# Altium footprint library Stepper_Board.PcbLib: 49 footprints (part 4 of 4)
Each footprint in its own frame and in the unit in brackets; x right, y up, seen from the top. Pads: shape width x height; smd on the part's side, far side on the other; paste and mask are expansions set on the pad; w line width, h text height; cw(c..) or ccw(c..) is an arc to the next point about the centre after c.
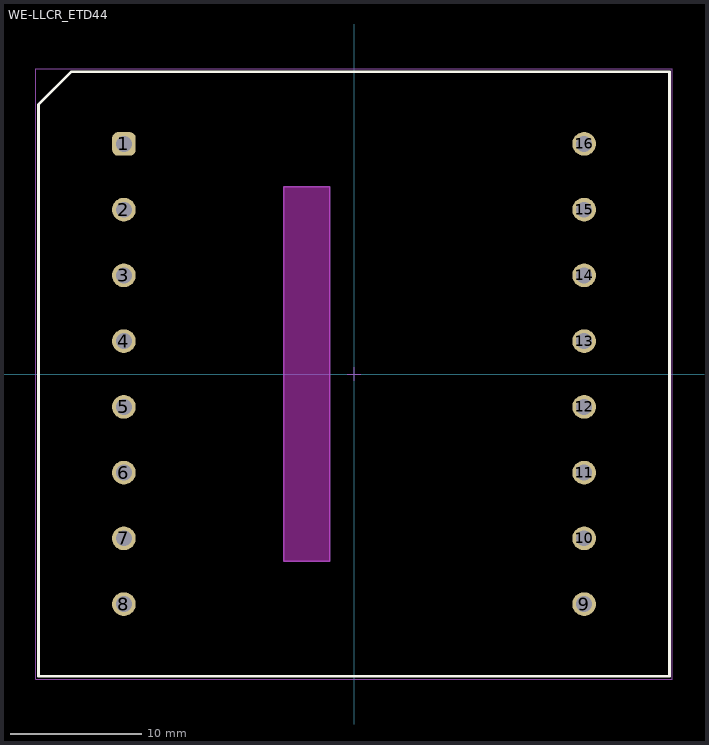
[diagram p3: the footprint, top view; thin cyan lines are the x and y axes]

## WE-LLCR_ETD44 [mm] "Resonant Converter, body 48x46mm"
height 27.5
pads (16):
  rrect50% 1.8x1.8 hole 1.2: 1(-17.5,17.5)
  round 1.8 hole 1.2: 2(-17.5,12.5) 3(-17.5,7.5) 4(-17.5,2.5) 5(-17.5,-2.5) 6(-17.5,-7.5) 7(-17.5,-12.5) 8(-17.5,-17.5) 9(17.5,-17.5) 10(17.5,-12.5) 11(17.5,-7.5) 12(17.5,-2.5) 13(17.5,2.5) 14(17.5,7.5) 15(17.5,12.5) 16(17.5,17.5)
Top Overlay:
  lines w0.2: -24,-23 24,-23 24,23 -21.5,23 -24,20.5 -24,-23
Keep-Out Layer:
  board cut-out: -5.35,14.25 -1.85,14.25 -1.85,-14.25 -5.35,-14.25
Top Courtyard:
  lines w0.05: -0.5,0 0.5,0 ; 0,-0.5 0,0.5 ; -24.2,-23.2 24.2,-23.2 24.2,23.2 -24.2,23.2 -24.2,-23.2
  lines w0.1: -5.35,-14.25 -5.35,14.25 -1.85,14.25 -1.85,-14.25 -3.6,-14.25 -5.35,-14.25
  text "PCB Cutout Area" at -3,-6 h2
Top Component Outline:
  lines w0.1: -24,-23 -24,20.5 -21.5,23 24,23 24,-23 -24,-23
3D body "ETD44_7608957x1.stp": height 26.85, standoff -3.35, extent -23.3,-22 23.3,22